# Altium footprint library B-NT_CHIPS.PcbLib: 90 footprints (part 1 of 6)
Each footprint in its own frame and in the unit in brackets; x right, y up, seen from the top. Pads: shape width x height; smd on the part's side, far side on the other; paste and mask are expansions set on the pad; w line width, h text height; cw(c..) or ccw(c..) is an arc to the next point about the centre after c.
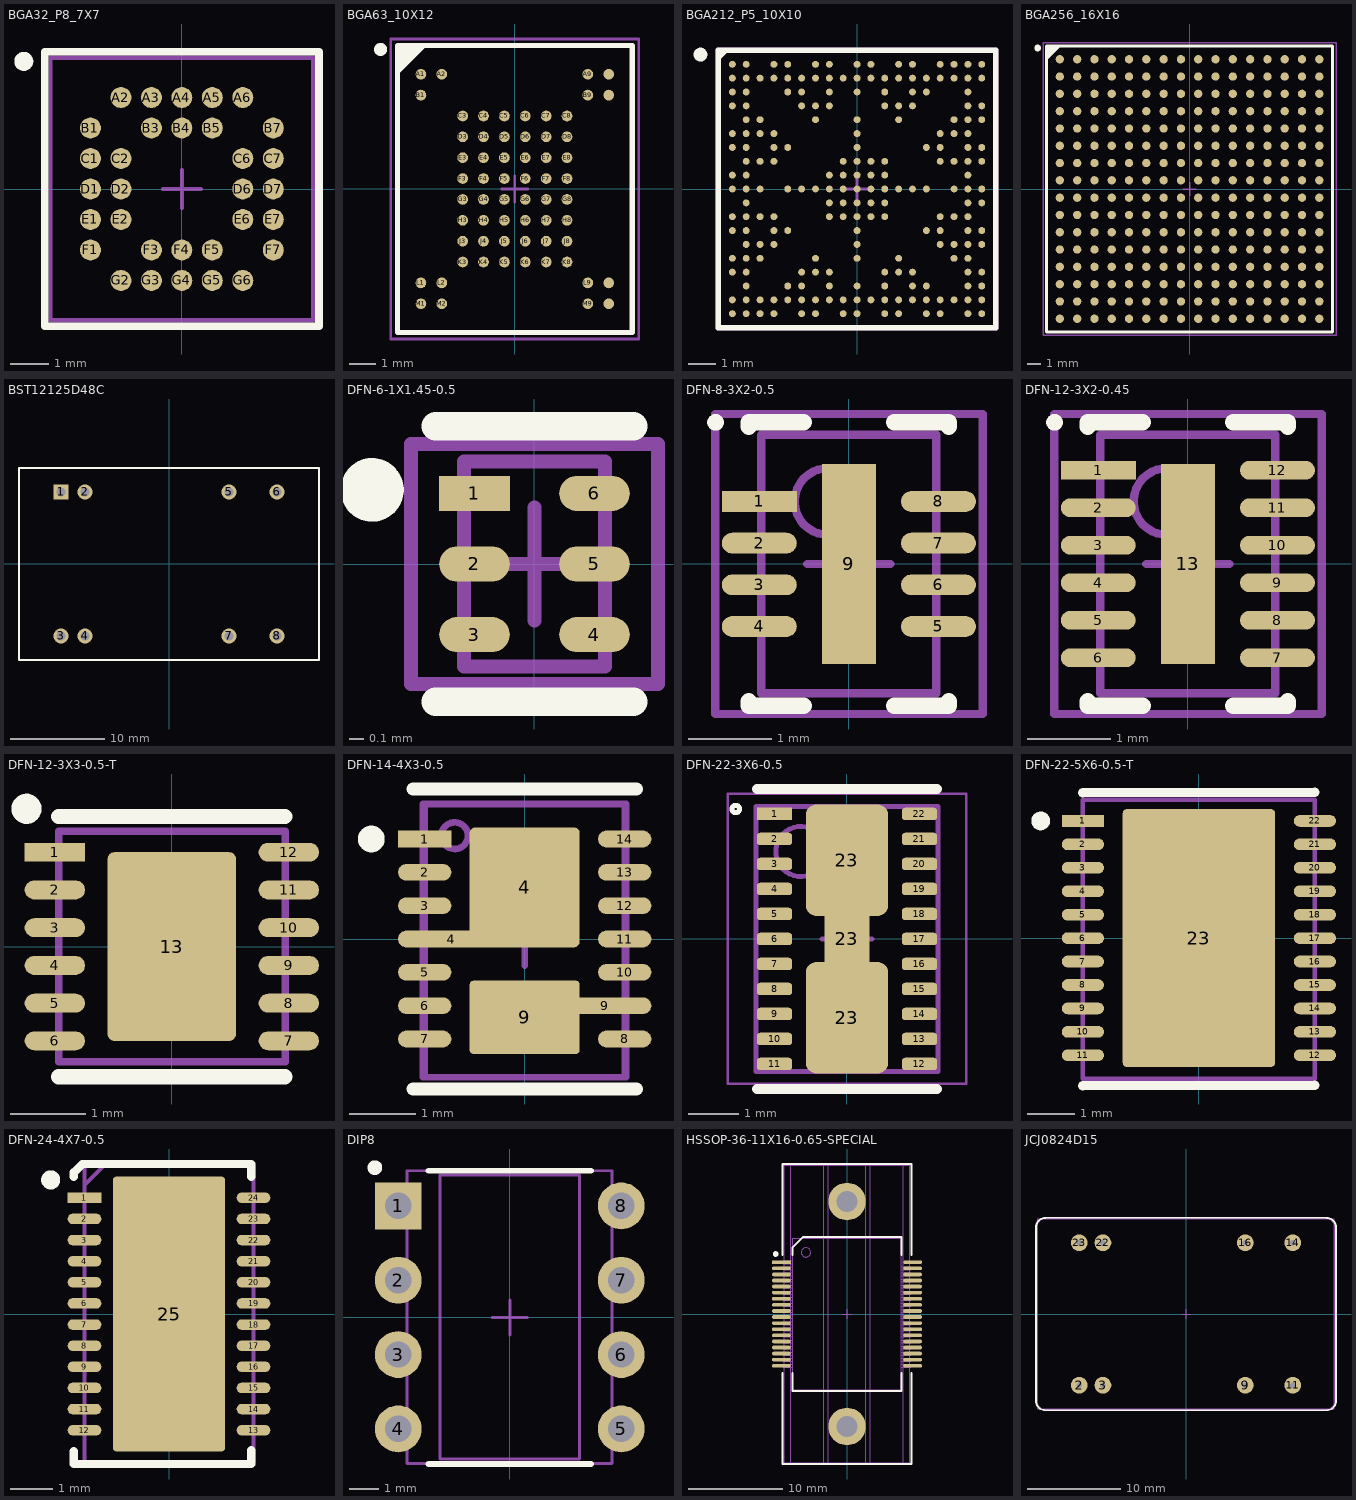
[diagram p0: the footprints below, top view; thin cyan lines are the x and y axes]

## BGA32_P8_7X7 [mm] "CBGA, 32-Leads, Body 7x7mmx3,8mm, Pitch 0,80mm"
height 3.8
pads (32):
  round 0.55 smd: A2(-1.6,2.4) A3(-0.8,2.4) A4(0,2.4) A5(0.8,2.4) A6(1.6,2.4) B1(-2.4,1.6) B3(-0.8,1.6) B4(0,1.6) B5(0.8,1.6) B7(2.4,1.6) C1(-2.4,0.8) C2(-1.6,0.8) C6(1.6,0.8) C7(2.4,0.8) D1(-2.4,0) D2(-1.6,0) D6(1.6,0) D7(2.4,0) E1(-2.4,-0.8) E2(-1.6,-0.8) E6(1.6,-0.8) E7(2.4,-0.8) F1(-2.4,-1.6) F3(-0.8,-1.6) F4(0,-1.6) F5(0.8,-1.6) F7(2.4,-1.6) G2(-1.6,-2.4) G3(-0.8,-2.4) G4(0,-2.4) G5(0.8,-2.4) G6(1.6,-2.4)
Top Overlay:
  circle w0.25: c-4.15,3.35 r0.125
  lines w0.2: -3.6,-3.6 -3.6,3.6 3.6,3.6 3.6,-3.6 -3.6,-3.6
M3 Top Assy:
  lines w0.1: -3.44,-3.44 -3.44,3.44 3.44,3.44 3.44,-3.44 -3.44,-3.44
M8 Top Brd Anno:
  lines w0.1: -0.5,0 0.5,0 ; 0,-0.5 0,0.5 ; 3.45,3.425 3.45,-3.45 -3.45,-3.45 -3.45,3.45 3.45,3.45
3D body "BGA32C80P7X7_688X688X380.step": height 3.8, standoff 0, extent -3.44,-3.44 3.44,3.44

## BGA63_10X12 [mm] "BGA, 63-Leads, Body 9,00x11,00mmx1,00mm, Pitch 0,80mm"
height 1
pads (63):
  round 0.41 smd: A1(-3.6,4.4) A2(-2.8,4.4) A9(2.8,4.4) A10(3.6,4.4) B1(-3.6,3.6) B9(2.8,3.6) B10(3.6,3.6) C3(-2,2.8) C4(-1.2,2.8) C5(-0.4,2.8) C6(0.4,2.8) C7(1.2,2.8) C8(2,2.8) D3(-2,2) D4(-1.2,2) D5(-0.4,2) D6(0.4,2) D7(1.2,2) D8(2,2) E3(-2,1.2) E4(-1.2,1.2) E5(-0.4,1.2) E6(0.4,1.2) E7(1.2,1.2) E8(2,1.2) F3(-2,0.4) F4(-1.2,0.4) F5(-0.4,0.4) F6(0.4,0.4) F7(1.2,0.4) F8(2,0.4) G3(-2,-0.4) G4(-1.2,-0.4) G5(-0.4,-0.4) G6(0.4,-0.4) G7(1.2,-0.4) G8(2,-0.4) H3(-2,-1.2) H4(-1.2,-1.2) H5(-0.4,-1.2) H6(0.4,-1.2) H7(1.2,-1.2) H8(2,-1.2) J3(-2,-2) J4(-1.2,-2) J5(-0.4,-2) J6(0.4,-2) J7(1.2,-2) J8(2,-2) K3(-2,-2.8) K4(-1.2,-2.8) K5(-0.4,-2.8) K6(0.4,-2.8) K7(1.2,-2.8) K8(2,-2.8) L1(-3.6,-3.6) L2(-2.8,-3.6) L9(2.8,-3.6) L10(3.6,-3.6) M1(-3.6,-4.4) M2(-2.8,-4.4) M9(2.8,-4.4) M10(3.6,-4.4)
Top Overlay:
  circle w0.25: c-5.15,5.35 r0.125
  region: -3.5,5.5 -4.5,4.5 -4.5,5.5
  lines w0.2: -4.5,4.5 -3.5,5.5 ; -4.5,-5.5 4.5,-5.5 4.5,5.5 -4.5,5.5 -4.5,-5.5
M3 Top Assy:
  lines w0.1: -4.5,-5.5 4.5,-5.5 4.5,5.5 -4.5,5.5 -4.5,-5.5
M8 Top Brd Anno:
  lines w0.1: -0.5,0 0.5,0 ; 0,-0.5 0,0.5 ; -4.75,-5.75 4.75,-5.75 4.75,5.75 -4.75,5.75 -4.75,-5.75
3D body "BGA63C80P10X12_900X1100X100.step": height 1, standoff 0, extent -4.5,-5.5 4.5,5.5

## BGA212_P5_10X10 [mm] "NFBGA, 212-Leads, Body 10x10mmx1,00mm, Pitch 0,50mm"
height 1
pads (212):
  round 0.25 smd paste-0.102: A1(-4.5,4.5) A2(-4,4.5) A4(-3,4.5) A5(-2.5,4.5) A7(-1.5,4.5) A8(-1,4.5) A10(0,4.5) A11(0.5,4.5) A13(1.5,4.5) A14(2,4.5) A16(3,4.5) A17(3.5,4.5) A18(4,4.5) A19(4.5,4.5) B1(-4.5,4) B2(-4,4) B3(-3.5,4) B4(-3,4) B5(-2.5,4) B6(-2,4) B7(-1.5,4) B8(-1,4) B9(-0.5,4) B10(0,4) B11(0.5,4) B12(1,4) B13(1.5,4) B14(2,4) B15(2.5,4) B16(3,4) B17(3.5,4) B18(4,4) B19(4.5,4) C1(-4.5,3.5) C2(-4,3.5) C5(-2.5,3.5) C6(-2,3.5) C8(-1,3.5) C10(0,3.5) C12(1,3.5) C14(2,3.5) C15(2.5,3.5) C18(4,3.5) D1(-4.5,3) D2(-4,3) D6(-2,3) D7(-1.5,3) D8(-1,3) D12(1,3) D13(1.5,3) D14(2,3) D18(4,3) D19(4.5,3) E2(-4,2.5) E3(-3.5,2.5) E7(-1.5,2.5) E10(0,2.5) E13(1.5,2.5) E17(3.5,2.5) E18(4,2.5) E19(4.5,2.5) F1(-4.5,2) F2(-4,2) F3(-3.5,2) F4(-3,2) F10(0,2) F16(3,2) F17(3.5,2) F18(4,2) G1(-4.5,1.5) G2(-4,1.5) G4(-3,1.5) G5(-2.5,1.5) G10(0,1.5) G15(2.5,1.5) G16(3,1.5) G18(4,1.5) G19(4.5,1.5) H2(-4,1) H3(-3.5,1) H4(-3,1) H9(-0.5,1) H10(0,1) H11(0.5,1) H12(1,1) H16(3,1) H17(3.5,1) H18(4,1) H19(4.5,1) J1(-4.5,0.5) J2(-4,0.5) J8(-1,0.5) J9(-0.5,0.5) J10(0,0.5) J11(0.5,0.5) J12(1,0.5) J18(4,0.5) K1(-4.5,0) K2(-4,0) K3(-3.5,0) K5(-2.5,0) K6(-2,0) K7(-1.5,0) K8(-1,0) K9(-0.5,0) K10(0,0) K11(0.5,0) K12(1,0) K13(1.5,0) K14(2,0) K15(2.5,0) K17(3.5,0) K18(4,0) K19(4.5,0) L2(-4,-0.5) L8(-1,-0.5) L9(-0.5,-0.5) L10(0,-0.5) L11(0.5,-0.5) L12(1,-0.5) L18(4,-0.5) L19(4.5,-0.5) M1(-4.5,-1) M2(-4,-1) M3(-3.5,-1) M4(-3,-1) M8(-1,-1) M9(-0.5,-1) M10(0,-1) M11(0.5,-1) M12(1,-1) M16(3,-1) M17(3.5,-1) M18(4,-1) N1(-4.5,-1.5) N2(-4,-1.5) N4(-3,-1.5) N5(-2.5,-1.5) N10(0,-1.5) N15(2.5,-1.5) N16(3,-1.5) N18(4,-1.5) N19(4.5,-1.5) P2(-4,-2) P3(-3.5,-2) P4(-3,-2) P10(0,-2) P16(3,-2) P17(3.5,-2) P18(4,-2) P19(4.5,-2) R1(-4.5,-2.5) R2(-4,-2.5) R3(-3.5,-2.5) R7(-1.5,-2.5) R10(0,-2.5) R13(1.5,-2.5) R17(3.5,-2.5) R18(4,-2.5) T1(-4.5,-3) T2(-4,-3) T6(-2,-3) T7(-1.5,-3) T8(-1,-3) T12(1,-3) T13(1.5,-3) T14(2,-3) T18(4,-3) T19(4.5,-3) U2(-4,-3.5) U5(-2.5,-3.5) U6(-2,-3.5) U8(-1,-3.5) U10(0,-3.5) U12(1,-3.5) U14(2,-3.5) U15(2.5,-3.5) U18(4,-3.5) U19(4.5,-3.5) V1(-4.5,-4) V2(-4,-4) V3(-3.5,-4) V4(-3,-4) V5(-2.5,-4) V6(-2,-4) V7(-1.5,-4) V8(-1,-4) V9(-0.5,-4) V10(0,-4) V11(0.5,-4) V12(1,-4) V13(1.5,-4) V14(2,-4) V15(2.5,-4) V16(3,-4) V17(3.5,-4) V18(4,-4) V19(4.5,-4) W1(-4.5,-4.5) W2(-4,-4.5) W3(-3.5,-4.5) W4(-3,-4.5) W6(-2,-4.5) W7(-1.5,-4.5) W9(-0.5,-4.5) W10(0,-4.5) W12(1,-4.5) W13(1.5,-4.5) W15(2.5,-4.5) W16(3,-4.5) W18(4,-4.5) W19(4.5,-4.5)
Top Overlay:
  circle w0.25: c-5.65,4.85 r0.125
  region: -4.742,5 -5,4.742 -5,5
  lines w0.2: -5,4.742 -4.742,5 ; -5,-5 -5,5 5,5 5,-5 -5,-5
M3 Top Assy:
  lines w0.1: -5,-5 -5,5 5,5 5,-5 -5,-5
M8 Top Brd Anno:
  lines w0.1: -0.5,0 0.5,0 ; 0,-0.5 0,0.5 ; -5.05,-5.05 -5.05,5.05 5.05,5.05 5.05,-5.05 -5.05,-5.05
3D body "User Library-bga-212_asm.STEP": height 0.9, standoff -0.1, extent -5,-5 5,5

## BGA256_16X16 [mm] "BGA, 256-Leads, Body 21,00x21,00mmx3,08mm, Pitch 1,27mm"
height 3.08
pads (256):
  round 0.61 smd: A1(-9.525,9.525) A2(-8.255,9.525) A3(-6.985,9.525) A4(-5.715,9.525) A5(-4.445,9.525) A6(-3.175,9.525) A7(-1.905,9.525) A8(-0.635,9.525) A9(0.635,9.525) A10(1.905,9.525) A11(3.175,9.525) A12(4.445,9.525) A13(5.715,9.525) A14(6.985,9.525) A15(8.255,9.525) A16(9.525,9.525) B1(-9.525,8.255) B2(-8.255,8.255) B3(-6.985,8.255) B4(-5.715,8.255) B5(-4.445,8.255) B6(-3.175,8.255) B7(-1.905,8.255) B8(-0.635,8.255) B9(0.635,8.255) B10(1.905,8.255) B11(3.175,8.255) B12(4.445,8.255) B13(5.715,8.255) B14(6.985,8.255) B15(8.255,8.255) B16(9.525,8.255) C1(-9.525,6.985) C2(-8.255,6.985) C3(-6.985,6.985) C4(-5.715,6.985) C5(-4.445,6.985) C6(-3.175,6.985) C7(-1.905,6.985) C8(-0.635,6.985) C9(0.635,6.985) C10(1.905,6.985) C11(3.175,6.985) C12(4.445,6.985) C13(5.715,6.985) C14(6.985,6.985) C15(8.255,6.985) C16(9.525,6.985) D1(-9.525,5.715) D2(-8.255,5.715) D3(-6.985,5.715) D4(-5.715,5.715) D5(-4.445,5.715) D6(-3.175,5.715) D7(-1.905,5.715) D8(-0.635,5.715) D9(0.635,5.715) D10(1.905,5.715) D11(3.175,5.715) D12(4.445,5.715) D13(5.715,5.715) D14(6.985,5.715) D15(8.255,5.715) D16(9.525,5.715) E1(-9.525,4.445) E2(-8.255,4.445) E3(-6.985,4.445) E4(-5.715,4.445) E5(-4.445,4.445) E6(-3.175,4.445) E7(-1.905,4.445) E8(-0.635,4.445) E9(0.635,4.445) E10(1.905,4.445) E11(3.175,4.445) E12(4.445,4.445) E13(5.715,4.445) E14(6.985,4.445) E15(8.255,4.445) E16(9.525,4.445) F1(-9.525,3.175) F2(-8.255,3.175) F3(-6.985,3.175) F4(-5.715,3.175) F5(-4.445,3.175) F6(-3.175,3.175) F7(-1.905,3.175) F8(-0.635,3.175) F9(0.635,3.175) F10(1.905,3.175) F11(3.175,3.175) F12(4.445,3.175) F13(5.715,3.175) F14(6.985,3.175) F15(8.255,3.175) F16(9.525,3.175) G1(-9.525,1.905) G2(-8.255,1.905) G3(-6.985,1.905) G4(-5.715,1.905) G5(-4.445,1.905) G6(-3.175,1.905) G7(-1.905,1.905) G8(-0.635,1.905) G9(0.635,1.905) G10(1.905,1.905) G11(3.175,1.905) G12(4.445,1.905) G13(5.715,1.905) G14(6.985,1.905) G15(8.255,1.905) G16(9.525,1.905) H1(-9.525,0.635) H2(-8.255,0.635) H3(-6.985,0.635) H4(-5.715,0.635) H5(-4.445,0.635) H6(-3.175,0.635) H7(-1.905,0.635) H8(-0.635,0.635) H9(0.635,0.635) H10(1.905,0.635) H11(3.175,0.635) H12(4.445,0.635) H13(5.715,0.635) H14(6.985,0.635) H15(8.255,0.635) H16(9.525,0.635) J1(-9.525,-0.635) J2(-8.255,-0.635) J3(-6.985,-0.635) J4(-5.715,-0.635) J5(-4.445,-0.635) J6(-3.175,-0.635) J7(-1.905,-0.635) J8(-0.635,-0.635) J9(0.635,-0.635) J10(1.905,-0.635) J11(3.175,-0.635) J12(4.445,-0.635) J13(5.715,-0.635) J14(6.985,-0.635) J15(8.255,-0.635) J16(9.525,-0.635) K1(-9.525,-1.905) K2(-8.255,-1.905) K3(-6.985,-1.905) K4(-5.715,-1.905) K5(-4.445,-1.905) K6(-3.175,-1.905) K7(-1.905,-1.905) K8(-0.635,-1.905) K9(0.635,-1.905) K10(1.905,-1.905) K11(3.175,-1.905) K12(4.445,-1.905) K13(5.715,-1.905) K14(6.985,-1.905) K15(8.255,-1.905) K16(9.525,-1.905) L1(-9.525,-3.175) L2(-8.255,-3.175) L3(-6.985,-3.175) L4(-5.715,-3.175) L5(-4.445,-3.175) L6(-3.175,-3.175) L7(-1.905,-3.175) L8(-0.635,-3.175) L9(0.635,-3.175) L10(1.905,-3.175) L11(3.175,-3.175) L12(4.445,-3.175) L13(5.715,-3.175) L14(6.985,-3.175) L15(8.255,-3.175) L16(9.525,-3.175) M1(-9.525,-4.445) M2(-8.255,-4.445) M3(-6.985,-4.445) M4(-5.715,-4.445) M5(-4.445,-4.445) M6(-3.175,-4.445) M7(-1.905,-4.445) M8(-0.635,-4.445) M9(0.635,-4.445) M10(1.905,-4.445) M11(3.175,-4.445) M12(4.445,-4.445) M13(5.715,-4.445) M14(6.985,-4.445) M15(8.255,-4.445) M16(9.525,-4.445) N1(-9.525,-5.715) N2(-8.255,-5.715) N3(-6.985,-5.715) N4(-5.715,-5.715) N5(-4.445,-5.715) N6(-3.175,-5.715) N7(-1.905,-5.715) N8(-0.635,-5.715) N9(0.635,-5.715) N10(1.905,-5.715) N11(3.175,-5.715) N12(4.445,-5.715) N13(5.715,-5.715) N14(6.985,-5.715) N15(8.255,-5.715) N16(9.525,-5.715) P1(-9.525,-6.985) P2(-8.255,-6.985) P3(-6.985,-6.985) P4(-5.715,-6.985) P5(-4.445,-6.985) P6(-3.175,-6.985) P7(-1.905,-6.985) P8(-0.635,-6.985) P9(0.635,-6.985) P10(1.905,-6.985) P11(3.175,-6.985) P12(4.445,-6.985) P13(5.715,-6.985) P14(6.985,-6.985) P15(8.255,-6.985) P16(9.525,-6.985) R1(-9.525,-8.255) R2(-8.255,-8.255) R3(-6.985,-8.255) R4(-5.715,-8.255) R5(-4.445,-8.255) R6(-3.175,-8.255) R7(-1.905,-8.255) R8(-0.635,-8.255) R9(0.635,-8.255) R10(1.905,-8.255) R11(3.175,-8.255) R12(4.445,-8.255) R13(5.715,-8.255) R14(6.985,-8.255) R15(8.255,-8.255) R16(9.525,-8.255) T1(-9.525,-9.525) T2(-8.255,-9.525) T3(-6.985,-9.525) T4(-5.715,-9.525) T5(-4.445,-9.525) T6(-3.175,-9.525) T7(-1.905,-9.525) T8(-0.635,-9.525) T9(0.635,-9.525) T10(1.905,-9.525) T11(3.175,-9.525) T12(4.445,-9.525) T13(5.715,-9.525) T14(6.985,-9.525) T15(8.255,-9.525) T16(9.525,-9.525)
Top Overlay:
  circle w0.25: c-11.15,10.35 r0.125
  region: -9.547,10.5 -10.5,9.547 -10.5,10.5
  lines w0.2: -10.5,9.547 -9.547,10.5 ; -10.5,-10.5 10.5,-10.5 10.5,10.5 -10.5,10.5 -10.5,-10.5
M3 Top Assy:
  lines w0.1: -10.5,-10.5 -10.5,10.5 10.5,10.5 10.5,-10.5 -10.5,-10.5
M8 Top Brd Anno:
  lines w0.1: -0.5,0 0.5,0 ; 0,-0.5 0,0.5 ; -10.75,-10.75 10.75,-10.75 10.75,10.75 -10.75,10.75 -10.75,-10.75
3D body "BGA256_16X16.step": height 3.08, standoff 0, extent -10.5,-10.5 10.5,10.5

## BST12125D48C [mm] "(31.75mm x 20.32mm x 12.07mm)"
height 12.07
pads (8):
  rect 1.6x1.6 hole 0.9: 1(-11.43,7.62)
  round 1.6 hole 0.9: 2(-8.89,7.62) 3(-11.43,-7.62) 4(-8.89,-7.62) 5(6.35,7.62) 6(11.43,7.62) 7(6.35,-7.62) 8(11.43,-7.62)
Top Overlay:
  lines w0.2: -15.875,-10.16 15.875,-10.16 15.875,10.16 -15.875,10.16 -15.875,-10.16
M3 Top Assy:
  lines w0.1: -15.875,-10.16 15.875,-10.16 15.875,10.16 -15.875,10.16 -15.875,-10.16
3D body: height 11.43, standoff 0.64, extent -15.875,-10.16 15.875,10.16
3D body: height 1.2, standoff 0, extent 25.4,0 25.4,0
3D body: height 11.43, standoff 0.64, extent -15.875,-10.16 15.875,10.16

## DFN-6-1X1.45-0.5 [mm]
pads (6):
  rect 0.5x0.25 smd: 1(-0.425,0.5)
  oval 0.5x0.25 smd: 2(-0.425,0) 3(-0.425,-0.5) 4(0.425,-0.5) 5(0.425,0) 6(0.425,0.5)
Top Overlay:
  circle w0.25: c-1.15,0.525 r0.1
  lines w0.2: -0.7,-0.975 0.7,-0.975 ; -0.7,0.975 0.7,0.975
M3 Top Assy:
  lines w0.1: -0.5,-0.725 0.5,-0.725 0.5,0.725 -0.5,0.725 -0.5,-0.725
M8 Top Brd Anno:
  lines w0.1: -0.4,0 0.4,0 ; 0,-0.4 0,0.4 ; -0.875,-0.85 -0.875,0.85 0.875,0.85 0.875,-0.85 0,-0.85 -0.875,-0.85
3D body "6-UFDFN.STEP": height 0.59, standoff -0.01, extent -0.5,-0.725 0.5,0.725

## DFN-8-3X2-0.5 [mm] "8-WFDFN Exposed Pad(3x2)"
height 0.8
pads (9):
  rect 0.9x0.25 smd: 1(-1.075,0.75)
  oval 0.9x0.25 smd: 2(-1.075,0.25) 3(-1.075,-0.25) 4(-1.075,-0.75) 5(1.075,-0.75) 6(1.075,-0.25) 7(1.075,0.25) 8(1.075,0.75)
  rect 0.65x2.4 smd: 9(0,0)
Top Overlay:
  circle w0.1: c-1.6,1.7 r0.05
  lines w0.2: -1.2,-1.65 -1.2,-1.7 -0.545,-1.7 ; -1.2,1.65 -1.2,1.7 -0.545,1.7 ; 0.545,-1.7 1.2,-1.7 1.2,-1.65 ; 0.545,1.7 1.2,1.7 1.2,1.65
M3 Top Assy:
  circle w0.1: c-0.25,0.75 r0.4
  lines w0.1: -1.05,-1.55 -1.05,1.55 1.05,1.55 1.05,-1.55 -1.05,-1.55
M8 Top Brd Anno:
  lines w0.1: -0.5,0 0.5,0 ; 0,-0.5 0,0.5 ; -1.605,-1.8 1.605,-1.8 1.605,1.8 -1.605,1.8 -1.605,-1.8
3D body "DFN8_3_0x2_0mm_0_50.step": height 0.81, standoff 0, extent -1,-1.5 1,1.5

## DFN-12-3X2-0.45 [mm] "12-WFDFN Exposed Pad(3x2)"
height 0.8
pads (13):
  rect 0.9x0.225 smd: 1(-1.075,1.125)
  oval 0.9x0.225 smd: 2(-1.075,0.675) 3(-1.075,0.225) 4(-1.075,-0.225) 5(-1.075,-0.675) 6(-1.075,-1.125) 7(1.075,-1.125) 8(1.075,-0.675) 9(1.075,-0.225) 10(1.075,0.225) 11(1.075,0.675) 12(1.075,1.125)
  rect 0.65x2.4 smd: 13(0,0)
Top Overlay:
  circle w0.1: c-1.6,1.7 r0.05
  lines w0.2: -1.2,-1.65 -1.2,-1.7 -0.545,-1.7 ; -1.2,1.65 -1.2,1.7 -0.545,1.7 ; 0.545,-1.7 1.2,-1.7 1.2,-1.65 ; 0.545,1.7 1.2,1.7 1.2,1.65
M3 Top Assy:
  circle w0.1: c-0.25,0.75 r0.4
  lines w0.1: -1.05,-1.55 1.05,-1.55 1.05,1.55 -1.05,1.55 -1.05,-1.55
M8 Top Brd Anno:
  lines w0.1: -0.5,0 0.5,0 ; 0,-0.5 0,0.5 ; -1.605,-1.8 -1.605,1.8 1.605,1.8 1.605,-1.8 -1.605,-1.8
3D body "DFN-12-3X2-0.45.step": height 0.8, standoff 0, extent -1.1,-1.55 1.1,1.55

## DFN-12-3X3-0.5-T [mm] "12-TDFN Exposed Pad(3х3)"
height 0.8
pads (13):
  rect 0.8x0.25 smd: 1(-1.55,1.25)
  oval 0.8x0.25 smd: 2(-1.55,0.75) 3(-1.55,0.25) 4(-1.55,-0.25) 5(-1.55,-0.75) 6(-1.55,-1.25) 7(1.55,-1.25) 8(1.55,-0.75) 9(1.55,-0.25) 10(1.55,0.25) 11(1.55,0.75) 12(1.55,1.25)
  rrect10% 1.7x2.5 smd: 13(0,0)
Top Overlay:
  circle w0.2: c-1.925,1.825 r0.1
  lines w0.2: -1.5,-1.725 1.5,-1.725 ; -1.5,1.725 1.5,1.725
M3 Top Assy:
  lines w0.1: -1.5,-1.525 -1.5,1.525 1.475,1.525 ; -1.475,-1.525 1.5,-1.525 1.5,1.525
M8 Top Brd Anno:
  lines w0.1: -0.4,0 0.4,0 ; 0,-0.4 0,0.4 ; -1.5,-1.525 -1.5,1.525 1.5,1.525 1.5,-1.525 -1.5,-1.525
3D body "User Library-TDFN-12-EP-3x3-05.STEP": height 0.75, standoff 0, extent -1.5,-1.5 1.5,1.5

## DFN-14-4X3-0.5 [mm] "14-Lead Plastic DFN (4mm ? 3mm)"
height 0.8
pads (16):
  rect 0.8x0.25 smd: 1(-1.5,1.5)
  oval 0.8x0.25 smd: 2(-1.5,1) 3(-1.5,0.5) 5(-1.5,-0.5) 6(-1.5,-1) 7(-1.5,-1.5) 8(1.5,-1.5) 10(1.5,-0.5) 11(1.5,0) 12(1.5,0.5) 13(1.5,1) 14(1.5,1.5)
  oval 1.6x0.25 smd: 4(-1.1,0)
  rrect10% 1.65x1.8 smd: 4(0,0.775)
  rrect10% 1.65x1.1 smd: 9(0,-1.175)
  oval 1.4x0.25 smd: 9(1.2,-1)
Top Overlay:
  circle w0.2: c-2.3,1.5 r0.1
  lines w0.2: -1.675,-2.25 1.675,-2.25 ; -1.675,2.25 1.675,2.25
M3 Top Assy:
  circle w0.1: c-1.05,1.55 r0.2
  lines w0.1: -1.5,-2.075 -1.5,2.025 1.5,2.025 1.5,-2.075 -1.5,-2.075
M8 Top Brd Anno:
  lines w0.1: -0.4,0 0.4,0 ; 0,-0.4 0,0.4 ; -1.525,-2.075 1.525,-2.075 1.525,2.025 0,2.025 -1.525,2.025 -1.525,-2.075
3D body "User Library-My-DFN-14-4x3-0_5.STEP": height 0.8, standoff 0, extent -1.56,-2.05 1.56,2.05

## DFN-22-3X6-0.5 [mm] "22-WFDFN Exposed Pad(6x3)"
height 0.8
pads (25):
  rect 0.7x0.25 smd: 1(-1.45,2.5)
  rrect50% 0.7x0.25 smd: 2(-1.45,2) 3(-1.45,1.5) 4(-1.45,1) 5(-1.45,0.5) 6(-1.45,0) 7(-1.45,-0.5) 8(-1.45,-1) 9(-1.45,-1.5) 10(-1.45,-2) 11(-1.45,-2.5) 12(1.45,-2.5) 13(1.45,-2) 14(1.45,-1.5) 15(1.45,-1) 16(1.45,-0.5) 17(1.45,0) 18(1.45,0.5) 19(1.45,1) 20(1.45,1.5) 21(1.45,2) 22(1.45,2.5)
  rrect25% 1.65x2.225 smd: 23(0,-1.575) 23(0,1.575)
  rect 0.9x1 smd: 23(0,0)
Top Overlay:
  circle w0.1: c-2.225,2.6 r0.075
  lines w0.2: -1.8,-3 1.8,-3 ; -1.8,3 1.8,3
M3 Top Assy:
  circle w0.1: c-0.925,1.75 r0.5
  lines w0.1: -1.825,-2.65 -1.825,2.65 1.825,2.65 1.825,-2.65 -1.825,-2.65
M8 Top Brd Anno:
  lines w0.05: -2.385,-2.9 -2.385,2.9 2.385,2.9 2.385,-2.9 -2.385,-2.9
  lines w0.1: -0.5,0 0.5,0 ; 0,-0.5 0,0.5
3D body "DFN-22-3X6-0.5.step": height 0.8, standoff 0, extent -1.875,-2.675 1.875,2.675

## DFN-22-5X6-0.5-T [mm] "22-LFDFN Exposed Pad(22-LSON (6x5))"
height 1.5
pads (23):
  rect 0.9x0.25 smd: 1(-2.475,2.5)
  oval 0.9x0.25 smd: 2(-2.475,2) 3(-2.475,1.5) 4(-2.475,1) 5(-2.475,0.5) 6(-2.475,0) 7(-2.475,-0.5) 8(-2.475,-1) 9(-2.475,-1.5) 10(-2.475,-2) 11(-2.475,-2.5) 12(2.475,-2.5) 13(2.475,-2) 14(2.475,-1.5) 15(2.475,-1) 16(2.475,-0.5) 17(2.475,0) 18(2.475,0.5) 19(2.475,1) 20(2.475,1.5) 21(2.475,2) 22(2.475,2.5)
  rrect5% 3.25x5.5 smd: 23(0,0)
Top Overlay:
  circle w0.2: c-3.375,2.5 r0.1
  lines w0.2: -2.475,-3.15 2.475,-3.137 ; -2.475,3.1 2.475,3.112
M3 Top Assy:
  lines w0.1: -2.475,-3 2.475,-3 2.475,2.95 -2.475,2.95 -2.475,-3
M8 Top Brd Anno:
  lines w0.1: -0.4,0 0.4,0 ; 0,-0.4 0,0.4 ; -2.475,-3 0,-3 2.475,-3 2.475,2.95 0,2.95 -2.475,2.95 -2.475,-3
3D body "DQP0022A.stp": height 1.5, standoff 0, extent -2.5,-3 2.5,3

## DFN-24-4X7-0.5 [mm] "24-WFDFN Exposed Pad(7х4)"
height 0.8
pads (25):
  rect 0.8x0.25 smd: 1(-2,2.75)
  oval 0.8x0.25 smd: 2(-2,2.25) 3(-2,1.75) 4(-2,1.25) 5(-2,0.75) 6(-2,0.25) 7(-2,-0.25) 8(-2,-0.75) 9(-2,-1.25) 10(-2,-1.75) 11(-2,-2.25) 12(-2,-2.75) 13(2,-2.75) 14(2,-2.25) 15(2,-1.75) 16(2,-1.25) 17(2,-0.75) 18(2,-0.25) 19(2,0.25) 20(2,0.75) 21(2,1.25) 22(2,1.75) 23(2,2.25) 24(2,2.75)
  rrect5% 2.65x6.5 smd: 25(0,0)
Top Overlay:
  circle w0.25: c-2.8,3.175 r0.1
  lines w0.2: -2.25,-3.25 -2.25,-3.55 1.95,-3.55 1.95,-3.225 ; -2.25,3.25 -2.25,3.35 ; 1.95,3.25 1.95,3.55 -2.05,3.55 -2.25,3.35 ; -2.25,3.35 -2.25,3.35
M3 Top Assy:
  lines w0.1: -2,3.05 -1.55,3.5 -1.45,3.5 ; -2,-3.5 -2,3.5 2,3.5 2,-3.5 -2,-3.5
M8 Top Brd Anno:
  lines w0.1: -0.4,0 0.4,0 ; 0,-0.4 0,0.4 ; -2,-3.5 2,-3.5 2,3.5 -2,3.5 -2,-3.5
3D body "User Library-DFN24.STEP": height 0.8, standoff 0, extent -2.001,-3.5 2,3.5

## DIP8 [mm] "8-DIP (0.300\", 7.62mm)"
height 5.33
pads (8):
  rect 1.6x1.6 hole 0.9: 1(-3.81,3.81)
  round 1.6 hole 0.9: 2(-3.81,1.27) 3(-3.81,-1.27) 4(-3.81,-3.81) 5(3.81,-3.81) 6(3.81,-1.27) 7(3.81,1.27) 8(3.81,3.81)
Top Overlay:
  circle w0.25: c-4.61,5.117 r0.125
  lines w0.2: -2.775,-5.01 0,-5.01 2.775,-5.01 ; -2.775,5.01 0,5.01 2.775,5.01
M3 Top Assy:
  lines w0.1: -3.51,-4.04 -3.91,-4.04 -3.91,-3.54 -3.51,-3.54 ; -3.51,-1.44 -3.91,-1.44 -3.91,-0.94 -3.51,-0.94 ; -3.51,1.06 -3.91,1.06 -3.91,1.56 -3.51,1.56 ; -3.51,3.56 -3.91,3.56 -3.91,4.06 -3.51,4.06 ; 3.49,-4.04 3.89,-4.04 3.89,-3.54 3.49,-3.54 ; 3.49,-1.54 3.89,-1.54 3.89,-1.04 3.49,-1.04 ; 3.49,1.06 3.89,1.06 3.89,1.56 3.49,1.56 ; 3.49,3.56 3.89,3.56 3.89,4.06 3.49,4.06 ; -3.51,-4.99 3.49,-4.99 3.49,5.01 -3.51,5.01 -3.51,-4.99
M8 Top Brd Anno:
  lines w0.1: -0.6,0 0.6,0 ; 0,-0.6 0,0.6 ; -2.385,-4.84 0,-4.84 2.385,-4.84 2.385,4.86 0,4.86 -2.385,4.86 -2.385,-4.84
3D body "DIP8N.STEP": height 3.65, standoff -1.66, extent -3.968,-4.74 3.948,4.76
3D body "DIP8N.STEP": height 3.65, standoff -1.66, extent -3.975,-4.74 3.94,4.76
3D body: height 0.25, standoff 0, extent 0.89,-1.79 0.89,-1.79

## HSSOP-36-11X16-0.65-SPECIAL [mm] "TOP-EXPOPAD +  radiator"
height 3.6
pads (38):
  rect 2x0.4 smd: 1(-7,5.525)
  oval 2x0.4 smd: 2(-7,4.875) 3(-7,4.225) 4(-7,3.575) 5(-7,2.925) 6(-7,2.275) 7(-7,1.625) 8(-7,0.975) 9(-7,0.325) 10(-7,-0.325) 11(-7,-0.975) 12(-7,-1.625) 13(-7,-2.275) 14(-7,-2.925) 15(-7,-3.575) 16(-7,-4.225) 17(-7,-4.875) 18(-7,-5.525) 19(7,-5.525) 20(7,-4.875) 21(7,-4.225) 22(7,-3.575) 23(7,-2.925) 24(7,-2.275) 25(7,-1.625) 26(7,-0.975) 27(7,-0.325) 28(7,0.325) 29(7,0.975) 30(7,1.625) 31(7,2.275) 32(7,2.925) 33(7,3.575) 34(7,4.225) 35(7,4.875) 36(7,5.525)
  round 4 hole 2.2: ""(0,-12) ""(0,12)
Top Overlay:
  circle w0.3: c-7.6,6.4 r0.15
  lines w0.2: -6.9,-6.3 -6.9,-16 6.9,-16 6.9,-6.3 ; -6.9,6.3 -6.9,16 6.9,16 6.9,6.3 ; -5.8,-6.3 -5.8,-8.2 5.8,-8.2 5.8,-6.3 ; -5.8,6.3 -5.8,7.1 -4.7,8.2 5.8,8.2 5.8,6.3
M3 Top Assy:
  drawing of 261 lines, arcs and shapes, not listed
M8 Top Brd Anno:
  lines w0.1: -0.5,0 0.5,0 ; 0,-0.5 0,0.5 ; -5.8,-8.1 5.8,-8.1 5.8,8.1 -5.8,8.1 -5.8,-8.1
3D body "36-HSSOP.STEP": height 3.9, standoff 0, extent -7.25,-8 7.25,8
3D body "dd1.STEP": height 8.7, standoff 3.9, extent -6.7,-15.95 6.76,15.8
3D body "ff2.STEP": height 6.5, standoff -1.76, extent -1.9,-13.9 1.9,13.9

## JCJ0824D15 [mm] "(31.8mm x 20.3mm x 10.2mm)"
height 10.2
pads (8):
  round 1.8 hole 0.6: 2(-11.43,-7.62) 3(-8.89,-7.62) 9(6.35,-7.62) 11(11.43,-7.62) 14(11.43,7.62) 16(6.35,7.62) 22(-8.89,7.62) 23(-11.43,7.62)
Top Overlay:
  lines w0.2: -15.05,10.275 ccw(c-15.05,9.275) -16.05,9.275 -16.05,-9.3 ccw(c-15.05,-9.3) -15.05,-10.3 15.05,-10.3 ccw(c15.05,-9.3) 16.05,-9.3 16.05,9.275 ccw(c15.05,9.275) 15.05,10.275 ; -15.05,10.3 15.05,10.3
M3 Top Assy:
  lines w0.1: -16,-9.3 -16,9.275 ; -16,-9.225 ccw(c-15,-9.225) -15,-10.225 ; -16,9.2 cw(c-15,9.2) -15,10.2 ; -15.075,-10.225 15.025,-10.225 ; -15.075,10.225 15.025,10.225 ; 14.95,-10.225 ccw(c14.95,-9.225) 15.95,-9.225 ; 14.95,10.2 cw(c14.95,9.2) 15.95,9.2 ; 15.95,-9.3 15.95,9.275
M8 Top Brd Anno:
  lines w0.1: -0.5,0 0.5,0 ; 0,-0.5 0,0.5 ; -15.875,-10.15 15.875,-10.15 15.875,10.175 -15.875,10.175 -15.875,-10.15
3D body "JCJ Series.STEP": height 10.16, standoff -3.05, extent -15.875,-10.145 15.875,10.175